# Altium footprint library 6-Connectors-3.PcbLib: 153 footprints (part 8 of 11)
Each footprint in its own frame and in the unit in brackets; x right, y up, seen from the top. Pads: shape width x height; smd on the part's side, far side on the other; paste and mask are expansions set on the pad; w line width, h text height; cw(c..) or ccw(c..) is an arc to the next point about the centre after c.
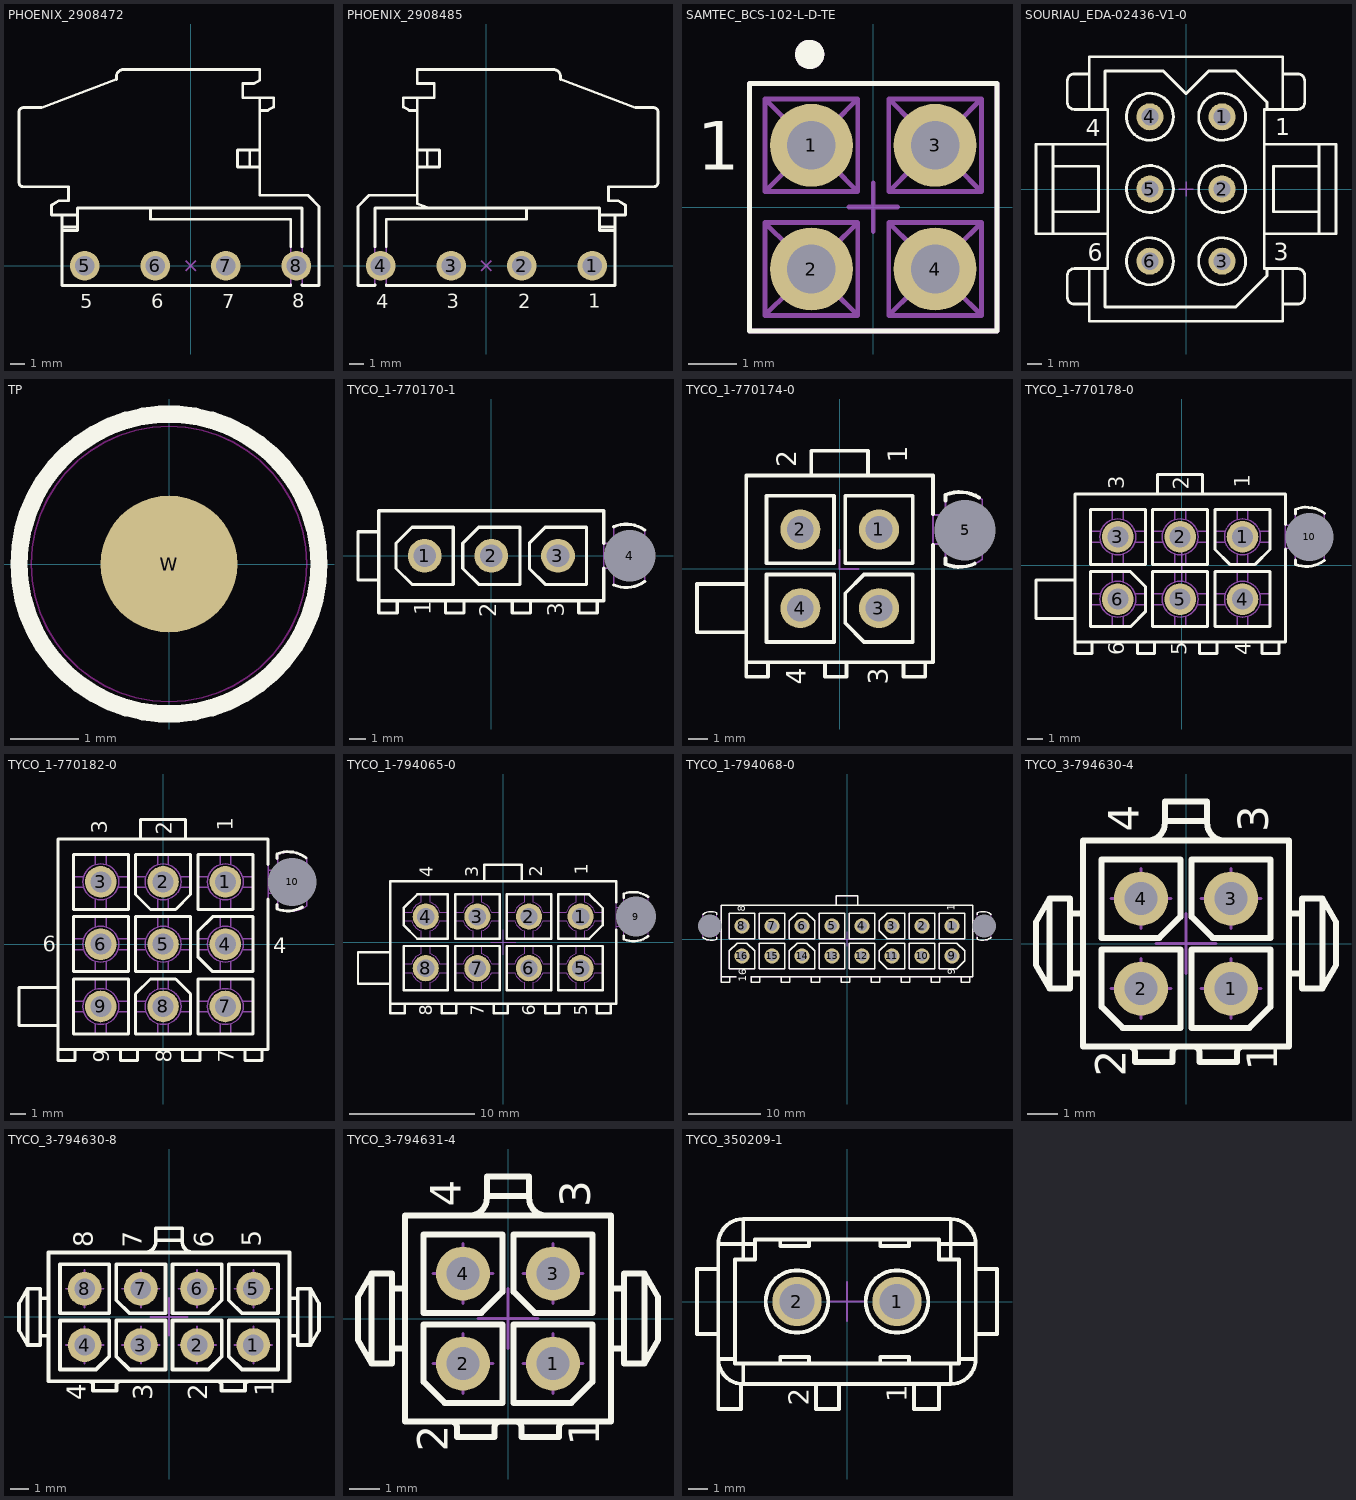
[diagram p7: the footprints below, top view; thin cyan lines are the x and y axes]

## PHOENIX_2908472 [mm] "24A 320V PCB Terminal Block, Pitch 5mm, 4 Positions, Screw Connection (Conductor/PCB connection direction: 0 ?"
height 16.45
pads (4):
  round 2.1 hole 1.4: 5(-7.5,0) 6(-2.5,0) 7(2.5,0) 8(7.5,0)
Top Overlay:
  lines w0.2: -9.1,2.5 -8,2.5 -8,4.1 7.9,4.1 7.9,1.342 ; -9.1,2.75 -8,2.75 ; -8,3.6 -9.1,3.6 ; -2.831,4.1 -2.831,3.3 7.1,3.3 7.1,1.342 ; 4.2,7 4.2,8.2 ; 4.9,7 3.334,7 3.334,8.2 4.9,8.2 ; 4.9,11 5.467,11 5.9,11.25 5.9,11.9 3.7,11.9 3.7,12.9 4.467,12.9 4.9,13.15 4.9,13.9 -4.75,13.9 ccw(c-4.75,13.4) -5.25,13.4 -5.25,13.2 -10.55,11.2 -11.85,11.2 ccw(c-11.85,10.9) -12.15,10.9 -12.15,5.9 ccw(c-11.85,5.9) -11.85,5.6 -8.65,5.6 -8.65,4.6 -9.33,4.6 -9.85,4.3 -9.85,3.6 -9.1,3.6 ; 4.9,11.9 4.9,5 8.3,5 9.1,4.2 9.1,-1.4 7.9,-1.4 7.9,-1.342 ; 7.1,-1.342 7.1,-1.4 -9.1,-1.4 -9.1,3.6
  text "8" at 7.2,-2.972 h1
  text "5" at -7.825,-3.025 h1
  text "6" at -2.8,-3.025 h1
  text "7" at 2.25,-3.025 h1
Mechanical 8:
  lines w0.1: -8,0 -7.5,0 ; -7.5,-0.5 -7.5,0 ; -7.5,0.5 -7.5,0 ; -7,0 -7.5,0 ; -3,0 -2.5,0 ; -2.5,-0.5 -2.5,0 ; -2.5,0.5 -2.5,0 ; -2,0 -2.5,0 ; -0.354,-0.354 0,0 ; -0.354,0.354 0,0 ; 0.354,-0.354 0,0 ; 0.354,0.354 0,0 ; 2,0 2.5,0 ; 2.5,-0.5 2.5,0 ; 2.5,0.5 2.5,0 ; 3,0 2.5,0 ; 7,0 7.5,0 ; 7.5,-0.5 7.5,0 ; 7.5,0.5 7.5,0 ; 8,0 7.5,0
Mechanical 14:
  lines w0.1: -9.1,2.5 -8,2.5 -8,4.1 7.9,4.1 7.9,-1.4 9.1,-1.4 9.1,4.2 8.3,5 4.9,5 4.9,11.9 ; -9.1,2.75 -8,2.75 ; -8,3.6 -9.1,3.6 ; -2.831,4.1 -2.831,3.3 7.1,3.3 7.1,-1.4 -9.1,-1.4 -9.1,3.6 ; 4.2,7 4.2,8.2 ; 4.9,7 3.334,7 3.334,8.2 4.9,8.2 ; 4.9,11 5.467,11 5.9,11.25 5.9,11.9 3.7,11.9 3.7,12.9 4.467,12.9 4.9,13.15 4.9,13.9 -4.75,13.9 ccw(c-4.75,13.4) -5.25,13.4 -5.25,13.2 -10.55,11.2 -11.85,11.2 ccw(c-11.85,10.9) -12.15,10.9 -12.15,5.9 ccw(c-11.85,5.9) -11.85,5.6 -8.65,5.6 -8.65,4.6 -9.33,4.6 -9.85,4.3 -9.85,3.6 -9.1,3.6 ; 7.1,-0.5 7.9,-0.5
  text "7" at 2.25,-3.025 h1
  text "6" at -2.8,-3.025 h1
  text "5" at -7.825,-3.025 h1
  text "8" at 7.2,-2.972 h1
3D body "PHOENIX_2908472.stp": height 16.45, standoff -4.5, extent -12.15,-1.4 9.1,13.9

## PHOENIX_2908485 [mm] "24A 320V Lateral Pin Exit Terminal Block, Pitch 5mm, 4 Positions, Screw Connection (Conductor/PCB connection direction: 0 ?"
height 16.45
pads (4):
  round 2.1 hole 1.4: 1(7.5,0) 2(2.5,0) 3(-2.5,0) 4(-7.5,0)
Top Overlay:
  lines w0.2: -7.9,-1.342 -7.9,-1.4 -9.1,-1.4 -9.1,4.2 -8.3,5 -4.9,5 ; -7.9,1.342 -7.9,4.1 8,4.1 8,2.5 9.1,2.5 ; -7.1,-1.342 -7.1,-1.4 9.1,-1.4 9.1,3.6 ; -7.1,1.342 -7.1,3.3 2.831,3.3 2.831,4.1 ; -4.9,7 -3.334,7 -3.334,8.2 -4.9,8.2 ; -4.9,11 -5.467,11 -5.9,11.25 -5.9,11.9 -3.7,11.9 -3.7,12.9 -4.9,12.9 -4.9,13.9 4.75,13.9 cw(c4.75,13.4) 5.25,13.4 5.25,13.2 10.55,11.2 11.85,11.2 cw(c11.85,10.9) 12.15,10.9 12.15,5.9 cw(c11.85,5.9) 11.85,5.6 8.65,5.6 8.65,4.6 9.33,4.6 9.85,4.3 9.85,3.6 8,3.6 ; -4.9,11.9 -4.9,4.4 -4.1,4.1 ; -4.2,7 -4.2,8.2 ; 8,2.75 9.1,2.75
  text "2" at 2.25,-3.025 h1
  text "3" at -2.8,-3.025 h1
  text "4" at -7.825,-3.025 h1
  text "1" at 7.2,-2.972 h1
Mechanical 8:
  lines w0.1: -8,0 -7.5,0 ; -7.5,-0.5 -7.5,0 ; -7.5,0.5 -7.5,0 ; -7,0 -7.5,0 ; -3,0 -2.5,0 ; -2.5,-0.5 -2.5,0 ; -2.5,0.5 -2.5,0 ; -2,0 -2.5,0 ; -0.354,-0.354 0,0 ; -0.354,0.354 0,0 ; 0.354,-0.354 0,0 ; 0.354,0.354 0,0 ; 2,0 2.5,0 ; 2.5,-0.5 2.5,0 ; 2.5,0.5 2.5,0 ; 3,0 2.5,0 ; 7,0 7.5,0 ; 7.5,-0.5 7.5,0 ; 7.5,0.5 7.5,0 ; 8,0 7.5,0
Mechanical 14:
  lines w0.1: -4.9,5 -8.3,5 -9.1,4.2 -9.1,-1.4 -7.9,-1.4 -7.9,4.1 8,4.1 8,2.5 9.1,2.5 ; -4.9,7 -3.334,7 -3.334,8.2 -4.9,8.2 ; -4.9,11 -5.467,11 -5.9,11.25 -5.9,11.9 -3.7,11.9 -3.7,12.9 -4.9,12.9 -4.9,13.9 4.75,13.9 cw(c4.75,13.4) 5.25,13.4 5.25,13.2 10.55,11.2 11.85,11.2 cw(c11.85,10.9) 12.15,10.9 12.15,5.9 cw(c11.85,5.9) 11.85,5.6 8.65,5.6 8.65,4.6 9.33,4.6 9.85,4.3 9.85,3.6 8,3.6 ; -4.9,11.9 -4.9,4.4 -4.1,4.1 ; -4.2,7 -4.2,8.2 ; 2.831,4.1 2.831,3.3 -7.1,3.3 -7.1,-1.4 9.1,-1.4 9.1,3.6 ; 8,2.75 9.1,2.75
  text "1" at 7.2,-2.972 h1
  text "4" at -7.825,-3.025 h1
  text "3" at -2.8,-3.025 h1
  text "2" at 2.25,-3.025 h1
3D body "PHOENIX_2908485.stp": height 16.45, standoff -4.5, extent -9.1,-1.4 12.15,13.9

## SAMTEC_BCS-102-L-D-TE [mm] "4 Contacts - Pitch 2.54mm - Dual Row Horizontal Entry Socket"
height 7.37
pads (4):
  round 1.7 hole 1: 1(-1.27,1.27) 2(-1.27,-1.27) 3(1.27,1.27) 4(1.27,-1.27)
Top Overlay:
  circle w0.3: c-1.305,3.135 r0.15
  lines w0.1: -2.54,-2.54 -2.54,2.54 2.54,2.54 2.54,-2.54 -2.54,-2.54
  text "1" at -3.617,0.772 h1
Mechanical 8:
  lines w0.1: -1.77,-1.27 -1.27,-1.27 ; -1.77,1.27 -1.27,1.27 ; -1.27,-1.77 -1.27,-1.27 ; -1.27,-0.77 -1.27,-1.27 ; -1.27,0.77 -1.27,1.27 ; -1.27,1.77 -1.27,1.27 ; -0.77,-1.27 -1.27,-1.27 ; -0.77,1.27 -1.27,1.27 ; -0.5,0 0,0 ; 0,-0.5 0,0 ; 0,0.5 0,0 ; 0.5,0 0,0 ; 0.77,-1.27 1.27,-1.27 ; 0.77,1.27 1.27,1.27 ; 1.27,-1.77 1.27,-1.27 ; 1.27,0.77 1.27,1.27 ; 1.27,1.77 1.27,1.27 ; 1.77,-1.27 1.27,-1.27 ; 1.77,1.27 1.27,1.27
Mechanical 14:
  circle w0.3: c-1.305,3.135 r0.15
  lines w0.1: -1.71,-0.83 -1.714,-1.714 ; -1.71,1.71 -1.714,0.826 ; 0.83,-0.83 0.826,-1.714 ; 0.83,1.71 0.826,0.826 ; -2.222,-2.222 -1.714,-1.714 ; -2.222,-2.222 -2.222,-0.318 ; -2.222,-2.222 -0.318,-2.222 ; -2.222,-0.318 -1.714,-0.826 -0.826,-0.826 ; -2.222,-0.318 -0.318,-0.318 ; -2.222,0.318 -1.714,0.826 ; -2.222,0.318 -2.222,2.222 ; -2.222,0.318 -0.318,0.318 ; -2.222,2.222 -1.714,1.714 -0.826,1.714 ; -2.222,2.222 -0.318,2.222 ; -1.714,-1.714 -0.826,-1.714 ; -1.714,0.826 -0.826,0.826 ; -0.826,-1.714 -0.318,-2.222 ; -0.826,-1.714 -0.826,-0.826 ; -0.826,-0.826 -0.318,-0.318 ; -0.826,0.826 -0.318,0.318 ; -0.826,0.826 -0.826,1.714 ; -0.826,1.714 -0.318,2.222 ; -0.318,-2.222 -0.318,-0.318 ; -0.318,0.318 -0.318,2.222 ; 0.318,-2.222 0.826,-1.714 ; 0.318,-2.222 0.318,-0.318 ; 0.318,-2.222 2.222,-2.222 ; 0.318,-0.318 0.826,-0.826 1.714,-0.826 ; 0.318,-0.318 2.222,-0.318 ; 0.318,0.318 0.826,0.826 ; 0.318,0.318 0.318,2.222 ; 0.318,0.318 2.222,0.318 ; 0.318,2.222 0.826,1.714 1.714,1.714 ; 0.318,2.222 2.222,2.222 ; 0.826,-1.714 1.714,-1.714 ; 0.826,0.826 1.714,0.826 ; 1.714,-1.714 2.222,-2.222 ; 1.714,-1.714 1.714,-0.826 ; 1.714,-0.826 2.222,-0.318 ; 1.714,0.826 2.222,0.318 ; 1.714,0.826 1.714,1.714 ; 1.714,1.714 2.222,2.222 ; 2.222,-2.222 2.222,-0.318 ; 2.222,0.318 2.222,2.222 ; -2.54,-2.54 -2.54,2.54 2.54,2.54 2.54,-2.54 -2.54,-2.54
  text "1" at -3.617,0.772 h1
3D body "SAMTEC_BCS-102-L-D-TE.stp": height 7.37, standoff -3.1, extent -2.54,-2.54 2.54,2.54

## SOURIAU_EDA-02436-V1-0 [mm] "SOURIAU SMS6P1 Adapter Kit For PCB Mount, 6 Poles Qikmate Male Connectors (Cable plug without strain relief hood)"
height 32.9
pads (6):
  round 1.9 hole 1.2: 1(2.54,5.08) 2(2.54,0) 3(2.54,-5.08) 4(-2.54,5.08) 5(-2.54,0) 6(-2.54,-5.08)
Top Overlay:
  circle w0.2: c2.54,-5.08 r1.65
  circle w0.2: c-2.54,-5.08 r1.65
  circle w0.2: c-2.54,0 r1.65
  circle w0.2: c2.54,0 r1.65
  circle w0.2: c2.54,5.08 r1.65
  circle w0.2: c-2.54,5.08 r1.65
  lines w0.2: -9.35,-3.15 -9.35,3.15 ; -9.35,-1.6 -7.35,-1.6 -6.15,-1.6 -6.15,1.6 -7.35,1.6 -9.35,1.6 ; -6.8,-8.1 -7.85,-8.1 cw(c-7.85,-7.6) -8.35,-7.6 -8.35,-6.1 cw(c-7.85,-6.1) -7.85,-5.6 -5.5,-5.6 -5.5,5.6 -7.85,5.6 cw(c-7.85,6.1) -8.35,6.1 -8.35,7.6 cw(c-7.85,7.6) -7.85,8.1 -6.8,8.1 ; -6.8,-5.6 -6.8,-9.3 6.8,-9.3 6.8,-5.6 ; -6.8,5.6 -6.8,9.3 6.8,9.3 6.8,5.6 ; -5.7,-5.6 -5.7,-8.3 3.5,-8.3 5.7,-6.1 5.7,-5.6 ; -5.7,5.6 -5.7,8.3 -1.6,8.3 0,6.7 1.6,8.3 3.5,8.3 5.7,6.1 5.7,5.6 ; -5.5,-3.15 -10.55,-3.15 -10.55,3.15 -5.5,3.15 ; 5.5,-3.15 10.55,-3.15 10.55,3.15 5.5,3.15 ; 6.8,-8.1 7.85,-8.1 ccw(c7.85,-7.6) 8.35,-7.6 8.35,-6.1 ccw(c7.85,-6.1) 7.85,-5.6 5.5,-5.6 5.5,5.6 7.85,5.6 ccw(c7.85,6.1) 8.35,6.1 8.35,7.6 ccw(c7.85,7.6) 7.85,8.1 6.8,8.1 ; 7.351,1.6 6.15,1.6 6.15,-1.6 9.35,-1.6 ; 7.357,1.6 9.35,1.6 ; 9.35,-3.15 9.35,3.15
  text "3" at 6.182,-4.999 h1.2
  text "6" at -6.909,-5.043 h1.2
  text "1" at 6.289,3.778 h1.2
  text "4" at -7.039,3.693 h1.2
Mechanical 8:
  lines w0.1: -3.04,-5.08 -2.54,-5.08 ; -3.04,0 -2.54,0 ; -3.04,5.08 -2.54,5.08 ; -2.54,-5.58 -2.54,-5.08 ; -2.54,-4.58 -2.54,-5.08 ; -2.54,-0.5 -2.54,0 ; -2.54,0.5 -2.54,0 ; -2.54,4.58 -2.54,5.08 ; -2.54,5.58 -2.54,5.08 ; -2.04,-5.08 -2.54,-5.08 ; -2.04,0 -2.54,0 ; -2.04,5.08 -2.54,5.08 ; -0.5,0 0,0 ; 0,-0.5 0,0 ; 0,0.5 0,0 ; 0.5,0 0,0 ; 2.04,-5.08 2.54,-5.08 ; 2.04,0 2.54,0 ; 2.04,5.08 2.54,5.08 ; 2.54,-5.58 2.54,-5.08 ; 2.54,-4.58 2.54,-5.08 ; 2.54,-0.5 2.54,0 ; 2.54,0.5 2.54,0 ; 2.54,4.58 2.54,5.08 ; 2.54,5.58 2.54,5.08 ; 3.04,-5.08 2.54,-5.08 ; 3.04,0 2.54,0 ; 3.04,5.08 2.54,5.08
Mechanical 14:
  circle w0.1: c2.54,-5.08 r1.65
  circle w0.1: c-2.54,-5.08 r1.65
  circle w0.1: c-2.54,0 r1.65
  circle w0.1: c2.54,0 r1.65
  circle w0.1: c2.54,5.08 r1.65
  circle w0.1: c-2.54,5.08 r1.65
  lines w0.1: -9.35,-3.15 -9.35,3.15 ; -9.35,-1.6 -7.35,-1.6 -6.15,-1.6 -6.15,1.6 -7.35,1.6 -9.35,1.6 ; -6.8,-8.1 -7.85,-8.1 cw(c-7.85,-7.6) -8.35,-7.6 -8.35,-6.1 cw(c-7.85,-6.1) -7.85,-5.6 -5.5,-5.6 -5.5,5.6 -7.85,5.6 cw(c-7.85,6.1) -8.35,6.1 -8.35,7.6 cw(c-7.85,7.6) -7.85,8.1 -6.8,8.1 ; -6.8,-5.6 -6.8,-9.3 6.8,-9.3 6.8,-5.6 ; -6.8,5.6 -6.8,9.3 6.8,9.3 6.8,5.6 ; -5.7,-5.6 -5.7,-8.3 3.5,-8.3 5.7,-6.1 5.7,-5.6 ; -5.7,5.6 -5.7,8.3 -1.6,8.3 0,6.7 1.6,8.3 3.5,8.3 5.7,6.1 5.7,5.6 ; -5.5,-3.15 -10.55,-3.15 -10.55,3.15 -5.5,3.15 ; 5.5,-3.15 10.55,-3.15 10.55,3.15 5.5,3.15 ; 6.8,-8.1 7.85,-8.1 ccw(c7.85,-7.6) 8.35,-7.6 8.35,-6.1 ccw(c7.85,-6.1) 7.85,-5.6 5.5,-5.6 5.5,5.6 7.85,5.6 ccw(c7.85,6.1) 8.35,6.1 8.35,7.6 ccw(c7.85,7.6) 7.85,8.1 6.8,8.1 ; 7.351,1.6 6.15,1.6 6.15,-1.6 9.35,-1.6 ; 7.357,1.6 9.35,1.6 ; 9.35,-3.15 9.35,3.15
  text "1" at 2.397,4.48 h1.2
  text "4" at -2.969,4.48 h1.2
  text "5" at -2.94,-0.6 h1.2
  text "2" at 2.14,-0.6 h1.2
  text "6" at -2.911,-5.68 h1.2
3D body "EDA-02436-V1-0.stp": height 33.2, standoff -13, extent -10.55,-9.3 10.55,9.3

## TP [mm]
height 11.7
pads (1):
  round 2 smd mask+1: W(0,0)
Top Overlay:
  circle w0.254: c0,0 r2.195
Keep-Out Layer:
  circle w0.025: c0,0 r2.017
3D body "1_016-1_016-3_tp.stp": height 0.02, standoff 0, extent -1.5,-1.5 1.5,1.5

## TYCO_1-770170-1 [mm] "3 Circuits In-Line - Mini-Universal MATE-N-LOK Connector"
height 14.25
pads (4):
  round 2.1 hole 1.4: 1(-4.14,0) 2(0,0) 3(4.14,0)
  round 1 hole 3.2 unplated mask+1.2: 4(8.59,0)
Top Overlay:
  lines w0.2: -6.985,-2.794 6.985,-2.794 6.985,-0.773 ; -6.985,-1.499 -8.28,-1.499 -8.28,1.499 -6.985,1.499 ; -5.842,-2.794 -5.842,-3.556 -6.985,-3.556 -6.985,2.794 6.985,2.794 6.985,0.773 ; -2.845,-2.794 -2.845,-3.556 -1.702,-3.556 -1.702,-2.794 ; 1.295,-2.794 1.295,-3.556 2.438,-3.556 2.438,-2.794 ; 5.436,-2.794 5.436,-3.556 6.579,-3.556 6.579,-2.794 ; 7.595,-1.804 ccw(c8.382,0) 9.525,-1.603 ; 7.595,1.804 cw(c8.382,0) 9.525,1.603 ; -5.918,-0.787 -5.918,0.787 -4.928,1.778 -2.362,1.778 -2.362,-1.778 -4.928,-1.778 -5.918,-0.787 ; -1.778,-0.787 -1.778,0.787 -0.787,1.778 1.778,1.778 1.778,-1.778 -0.787,-1.778 -1.778,-0.787 ; 2.362,-0.787 3.353,-1.778 5.918,-1.778 5.918,1.778 3.353,1.778 2.362,0.787 2.362,-0.787
  text "2" at 0.305,-3.81 h1.02
  text "1" at -3.759,-3.683 h1.02
  text "3" at 4.521,-3.783 h1.02
Mechanical 8:
  lines w0.1: -4.64,0 -4.14,0 ; -4.14,-0.5 -4.14,0 ; -4.14,0.5 -4.14,0 ; -3.64,0 -4.14,0 ; -0.5,0 0,0 ; 0,-0.5 0,0 ; 0,0.5 0,0 ; 0.5,0 0,0 ; 3.64,0 4.14,0 ; 4.14,-0.5 4.14,0 ; 4.14,0.5 4.14,0 ; 4.64,0 4.14,0 ; 8.09,0 8.59,0 ; 8.59,-0.5 8.59,0 ; 8.59,0.5 8.59,0 ; 9.09,0 8.59,0
Mechanical 14:
  circle w0.1: c4.14,0 r0.5
  circle w0.1: c0,0 r0.5
  circle w0.1: c-4.14,0 r0.5
  lines w0.1: -6.985,-2.794 6.985,-2.794 6.985,2.794 -6.985,2.794 -6.985,-3.556 -5.842,-3.556 -5.842,-2.794 ; -6.985,-1.499 -8.28,-1.499 -8.28,1.499 -6.985,1.499 ; -2.845,-2.794 -2.845,-3.556 -1.702,-3.556 -1.702,-2.794 ; 1.295,-2.794 1.295,-3.556 2.438,-3.556 2.438,-2.794 ; 5.436,-2.794 5.436,-3.556 6.579,-3.556 6.579,-2.794 ; 6.985,-0.762 7.595,-0.762 ; 6.985,0.762 7.595,0.762 ; 7.62,-0.795 7.62,0.795 ; 9.525,-0.881 cw(c8.611,0) 7.595,-0.762 ; 9.525,0.881 ccw(c8.611,0) 7.595,0.762 ; 7.595,-0.762 7.595,-1.804 ccw(c8.382,0) 9.525,-1.603 9.525,1.603 ccw(c8.382,0) 7.595,1.804 7.595,0.762 ; -5.918,-0.787 -5.918,0.787 -4.928,1.778 -2.362,1.778 -2.362,-1.778 -4.928,-1.778 -5.918,-0.787 ; -1.778,-0.787 -1.778,0.787 -0.787,1.778 1.778,1.778 1.778,-1.778 -0.787,-1.778 -1.778,-0.787 ; 2.362,-0.787 3.353,-1.778 5.918,-1.778 5.918,1.778 3.353,1.778 2.362,0.787 2.362,-0.787
  text "2" at 0.305,-3.81 h1.02
  text "1" at -3.759,-3.683 h1.02
  text "3" at 4.521,-3.783 h1.02
3D body "TYCO_1-770170-1.stp": height 14.25, standoff -4.32, extent -8.28,-3.556 9.525,2.794

## TYCO_1-770174-0 [mm] "4 Circuits Dual-Row - Mini-Universal MATE-N-LOK Connector"
height 14.25
pads (5):
  round 2.1 hole 1.4: 1(2.07,2.07) 2(-2.07,2.07) 3(2.07,-2.07) 4(-2.07,-2.07)
  round 1 hole 3.2 unplated mask+1.2: 5(6.604,2.032)
Top Overlay:
  lines w0.2: -4.915,-3.34 -7.506,-3.34 -7.506,-0.8 -4.915,-0.8 ; -3.772,-4.915 -3.772,-5.677 -4.915,-5.677 -4.915,-4.915 ; -1.499,4.915 -1.499,6.21 1.499,6.21 1.499,4.915 ; -0.775,-4.915 -0.775,-5.677 0.368,-5.677 0.368,-4.915 ; 3.366,-4.915 3.366,-5.677 4.509,-5.677 4.509,-4.915 ; 4.915,1.256 4.915,-4.915 -4.915,-4.915 ; 4.915,2.885 4.915,4.915 -4.915,4.915 -4.915,-4.915 ; 5.575,0.538 5.575,0.245 ccw(c6.312,2.07) 7.115,0.273 ; 5.575,3.602 5.575,3.896 cw(c6.312,2.07) 7.347,3.745 ; -3.848,-3.848 -3.848,-0.292 -0.292,-0.292 -0.292,-3.848 -3.848,-3.848 ; -3.848,0.292 -0.292,0.292 -0.292,3.848 -3.848,3.848 -3.848,0.292 ; 0.292,-2.858 0.292,-1.283 1.283,-0.292 3.848,-0.292 3.848,-3.848 1.283,-3.848 0.292,-2.858 ; 0.292,0.292 3.848,0.292 3.848,3.848 0.292,3.848 0.292,0.292
  text "3" at 2.54,-6.096 h1.02
  text "4" at -1.778,-6.096 h1.02
  text "2" at -2.286,5.334 h1.02
  text "1" at 3.556,5.588 h1.02
Mechanical 8:
  lines w0.1: 0,1 0,0 1,0
Mechanical 14:
  lines w0.1: -4.915,-3.34 -7.506,-3.34 -7.506,-0.8 -4.915,-0.8 ; -3.772,-4.915 -3.772,-5.677 -4.915,-5.677 -4.915,-4.915 ; -1.499,4.915 -1.499,6.21 1.499,6.21 1.499,4.915 ; -0.775,-4.915 -0.775,-5.677 0.368,-5.677 0.368,-4.915 ; 3.366,-4.915 3.366,-5.677 4.509,-5.677 4.509,-4.915 ; 4.915,1.308 5.575,1.308 5.575,0.245 ccw(c6.312,2.07) 7.506,0.505 7.506,3.635 ccw(c6.312,2.07) 5.575,3.896 5.575,2.832 4.915,2.832 ; 5.575,1.245 ccw(c6.541,2.07) 7.506,1.245 ; 5.575,2.896 cw(c6.541,2.07) 7.506,2.896 ; -4.915,-4.915 -4.915,4.915 4.915,4.915 4.915,-4.915 -4.915,-4.915 ; -3.848,-3.848 -3.848,-0.292 -0.292,-0.292 -0.292,-3.848 -3.848,-3.848 ; -3.848,0.292 -0.292,0.292 -0.292,3.848 -3.848,3.848 -3.848,0.292 ; 0.292,-2.858 0.292,-1.283 1.283,-0.292 3.848,-0.292 3.848,-3.848 1.283,-3.848 0.292,-2.858 ; 0.292,0.292 3.848,0.292 3.848,3.848 0.292,3.848 0.292,0.292
  text "3" at 2.54,-6.096 h1.02
  text "4" at -1.778,-6.096 h1.02
  text "2" at -2.286,5.334 h1.02
  text "1" at 3.556,5.588 h1.02
3D body "TYCO_1-770174-0.stp": height 14.25, standoff -4.32, extent -7.506,-5.677 7.506,6.21

## TYCO_1-770178-0 [mm] "6 Circuits Vertiacal Mini-Universal MATE-N-LOK Connector"
height 14.25
pads (7):
  round 2.1 hole 1.4: 1(4.023,1.894) 2(-0.117,1.894) 3(-4.257,1.894) 4(4.023,-2.246) 5(-0.117,-2.246) 6(-4.257,-2.246)
  round 1 hole 3.2 unplated mask+1.2: 10(8.473,1.894)
Top Overlay:
  lines w0.2: -7.102,-3.516 -9.693,-3.516 -9.693,-0.976 -7.102,-0.976 ; -5.959,-5.091 -5.959,-5.853 -7.102,-5.853 -7.102,-5.091 ; -2.962,-5.091 -2.962,-5.853 -1.819,-5.853 -1.819,-5.091 ; -1.616,4.739 -1.616,6.035 1.381,6.035 1.381,4.739 ; 1.178,-5.091 1.178,-5.853 2.321,-5.853 2.321,-5.091 ; 5.318,-5.091 5.318,-5.853 6.461,-5.853 6.461,-5.091 ; 6.868,1.08 6.868,-5.091 -7.102,-5.091 ; 6.868,2.701 6.868,4.731 ; 6.868,4.739 -7.102,4.739 -7.102,-5.091 ; 7.528,0.362 7.528,0.069 ccw(c8.265,1.894) 9.459,0.329 ; 7.528,3.426 7.528,3.72 cw(c8.265,1.894) 9.459,3.46 ; -6.086,-4.075 -3.417,-4.075 -2.429,-3.087 -2.429,-1.405 -3.417,-0.417 -6.086,-0.417 -6.086,-4.075 ; -6.086,0.066 -2.429,0.066 -2.429,3.723 -6.086,3.723 -6.086,0.066 ; -1.946,-4.075 1.712,-4.075 1.712,-0.417 -1.946,-0.417 -1.946,-4.075 ; -1.946,0.066 1.712,0.066 1.712,3.723 -1.946,3.723 -1.946,0.066 ; 2.194,-4.075 5.852,-4.075 5.852,-0.417 2.194,-0.417 2.194,-4.075 ; 2.194,1.053 2.194,3.723 5.852,3.723 5.852,1.053 4.864,0.066 3.182,0.066 2.194,1.053
  text "2" at 0.459,5.015 h1.02
  text "6" at -3.829,-5.977 h1.02
  text "5" at 0.311,-5.977 h1.02
  text "4" at 4.578,-5.977 h1.02
  text "3" at -3.842,5.069 h1.02
  text "1" at 4.513,5.142 h1.02
Mechanical 8:
  lines w0.1: -5.257,-2.246 -4.257,-2.246 ; -5.257,1.894 -4.257,1.894 ; -4.257,-3.246 -4.257,-2.246 ; -4.257,-1.246 -4.257,-2.246 ; -4.257,0.894 -4.257,1.894 ; -4.257,2.894 -4.257,1.894 ; -3.257,-2.246 -4.257,-2.246 ; -3.257,1.894 -4.257,1.894 ; -1.117,-2.246 -0.117,-2.246 ; -1.117,1.894 -0.117,1.894 ; -1,0 0,0 ; -0.117,-3.246 -0.117,-2.246 ; -0.117,-1.246 -0.117,-2.246 ; -0.117,0.894 -0.117,1.894 ; -0.117,2.894 -0.117,1.894 ; 0,-1 0,0 ; 0,1 0,0 ; 0.883,-2.246 -0.117,-2.246 ; 0.883,1.894 -0.117,1.894 ; 1,0 0,0 ; 3.023,-2.246 4.023,-2.246 ; 3.023,1.894 4.023,1.894 ; 4.023,-3.246 4.023,-2.246 ; 4.023,-1.246 4.023,-2.246 ; 4.023,0.894 4.023,1.894 ; 4.023,2.894 4.023,1.894 ; 5.023,-2.246 4.023,-2.246 ; 5.023,1.894 4.023,1.894 ; 7.473,1.894 8.473,1.894 ; 8.473,0.894 8.473,1.894 ; 8.473,2.894 8.473,1.894 ; 9.473,1.894 8.473,1.894
Mechanical 14:
  circle w0.1: c4.023,-2.246 r1.194
  circle w0.1: c4.023,-2.246 r0.5
  circle w0.1: c-0.117,-2.246 r1.194
  circle w0.1: c-0.117,-2.246 r0.5
  circle w0.1: c-0.117,1.894 r1.194
  circle w0.1: c-0.117,1.894 r0.5
  circle w0.1: c-4.257,1.894 r1.194
  circle w0.1: c-4.257,1.894 r0.5
  circle w0.1: c4.023,1.894 r1.194
  circle w0.1: c4.023,1.894 r0.5
  circle w0.1: c-4.257,-2.246 r1.194
  circle w0.1: c-4.257,-2.246 r0.5
  lines w0.1: -7.102,-3.516 -9.693,-3.516 -9.693,-0.976 -7.102,-0.976 ; -6.086,-2.601 -5.397,-2.601 ; -6.086,-1.89 -5.397,-1.89 ; -6.086,1.539 -5.397,1.539 ; -6.086,2.25 -5.397,2.25 ; -5.959,-5.091 -5.959,-5.853 -7.102,-5.853 -7.102,-5.091 ; -4.613,-4.075 -4.613,-3.385 ; -4.613,-1.106 -4.613,-0.417 ; -4.613,0.066 -4.613,0.755 ; -4.613,3.034 -4.613,3.723 ; -3.902,-4.075 -3.902,-3.385 ; -3.902,-1.106 -3.902,-0.417 ; -3.902,0.066 -3.902,0.755 ; -3.902,3.034 -3.902,3.723 ; -3.118,-2.601 -2.429,-2.601 ; -3.118,-1.89 -2.429,-1.89 ; -3.118,1.539 -2.429,1.539 ; -3.118,2.25 -2.429,2.25 ; -2.962,-5.091 -2.962,-5.853 -1.819,-5.853 -1.819,-5.091 ; -1.946,-2.601 -1.257,-2.601 ; -1.946,-1.89 -1.257,-1.89 ; -1.946,1.539 -1.257,1.539 ; -1.946,2.25 -1.257,2.25 ; -1.616,4.739 -1.616,6.035 1.381,6.035 1.381,4.739 ; -0.473,-4.075 -0.473,-3.385 ; -0.473,-1.106 -0.473,-0.417 ; -0.473,0.066 -0.473,0.755 ; -0.473,3.034 -0.473,3.723 ; 0.238,-4.075 0.238,-3.385 ; 0.238,-1.106 0.238,-0.417 ; 0.238,0.066 0.238,0.755 ; 0.238,3.034 0.238,3.723 ; 1.022,-2.601 1.712,-2.601 ; 1.022,-1.89 1.712,-1.89 ; 1.022,1.539 1.712,1.539 ; 1.022,2.25 1.712,2.25 ; 1.178,-5.091 1.178,-5.853 2.321,-5.853 2.321,-5.091 ; 2.194,-2.601 2.883,-2.601 ; 2.194,-1.89 2.883,-1.89 ; 2.194,1.539 2.883,1.539 ; 2.194,2.25 2.883,2.25 ; 3.667,-4.075 3.667,-3.385 ; 3.667,-1.106 3.667,-0.417 ; 3.667,0.066 3.667,0.755 ; 3.667,3.034 3.667,3.723 ; 4.379,-4.075 4.379,-3.385 ; 4.379,-1.106 4.379,-0.417 ; 4.379,0.066 4.379,0.755 ; 4.379,3.034 4.379,3.723 ; 5.163,-2.601 5.852,-2.601 ; 5.163,-1.89 5.852,-1.89 ; 5.163,1.539 5.852,1.539 ; 5.163,2.25 5.852,2.25 ; 5.318,-5.091 5.318,-5.853 6.461,-5.853 6.461,-5.091 ; 6.868,1.132 7.528,1.132 ; 6.868,2.656 7.528,2.656 ; 7.528,1.069 ccw(c8.493,1.894) 9.459,1.069 ; 7.528,2.72 cw(c8.493,1.894) 9.459,2.72 ; -7.102,-5.091 6.868,-5.091 6.868,4.739 -7.102,4.739 -7.102,-5.091 ; -6.086,-4.075 -3.417,-4.075 -2.429,-3.087 -2.429,-1.405 -3.417,-0.417 -6.086,-0.417 -6.086,-4.075 ; -6.086,0.066 -2.429,0.066 -2.429,3.723 -6.086,3.723 -6.086,0.066 ; -1.946,-4.075 1.712,-4.075 1.712,-0.417 -1.946,-0.417 -1.946,-4.075 ; -1.946,0.066 1.712,0.066 1.712,3.723 -1.946,3.723 -1.946,0.066 ; 2.194,-4.075 5.852,-4.075 5.852,-0.417 2.194,-0.417 2.194,-4.075 ; 2.194,1.053 2.194,3.723 5.852,3.723 5.852,1.053 4.864,0.066 3.182,0.066 2.194,1.053 ; 7.528,0.069 ccw(c8.265,1.894) 9.459,0.329 9.459,3.46 ccw(c8.265,1.894) 7.528,3.72 7.528,0.069
  text "2" at 0.459,5.015 h1.02
  text "6" at -3.829,-5.977 h1.02
  text "5" at 0.311,-5.977 h1.02
  text "4" at 4.578,-5.977 h1.02
  text "3" at -3.842,5.069 h1.02
  text "1" at 4.513,5.142 h1.02
3D body "TYCO_1-770178-0.stp": height 14.25, standoff -4.32, extent -9.693,-5.853 9.459,6.035
